# Altium footprint library PowerMonitoring.PcbLib: 27 footprints (part 2 of 2)
Each footprint in its own frame and in the unit in brackets; x right, y up, seen from the top. Pads: shape width x height; smd on the part's side, far side on the other; paste and mask are expansions set on the pad; w line width, h text height; cw(c..) or ccw(c..) is an arc to the next point about the centre after c.
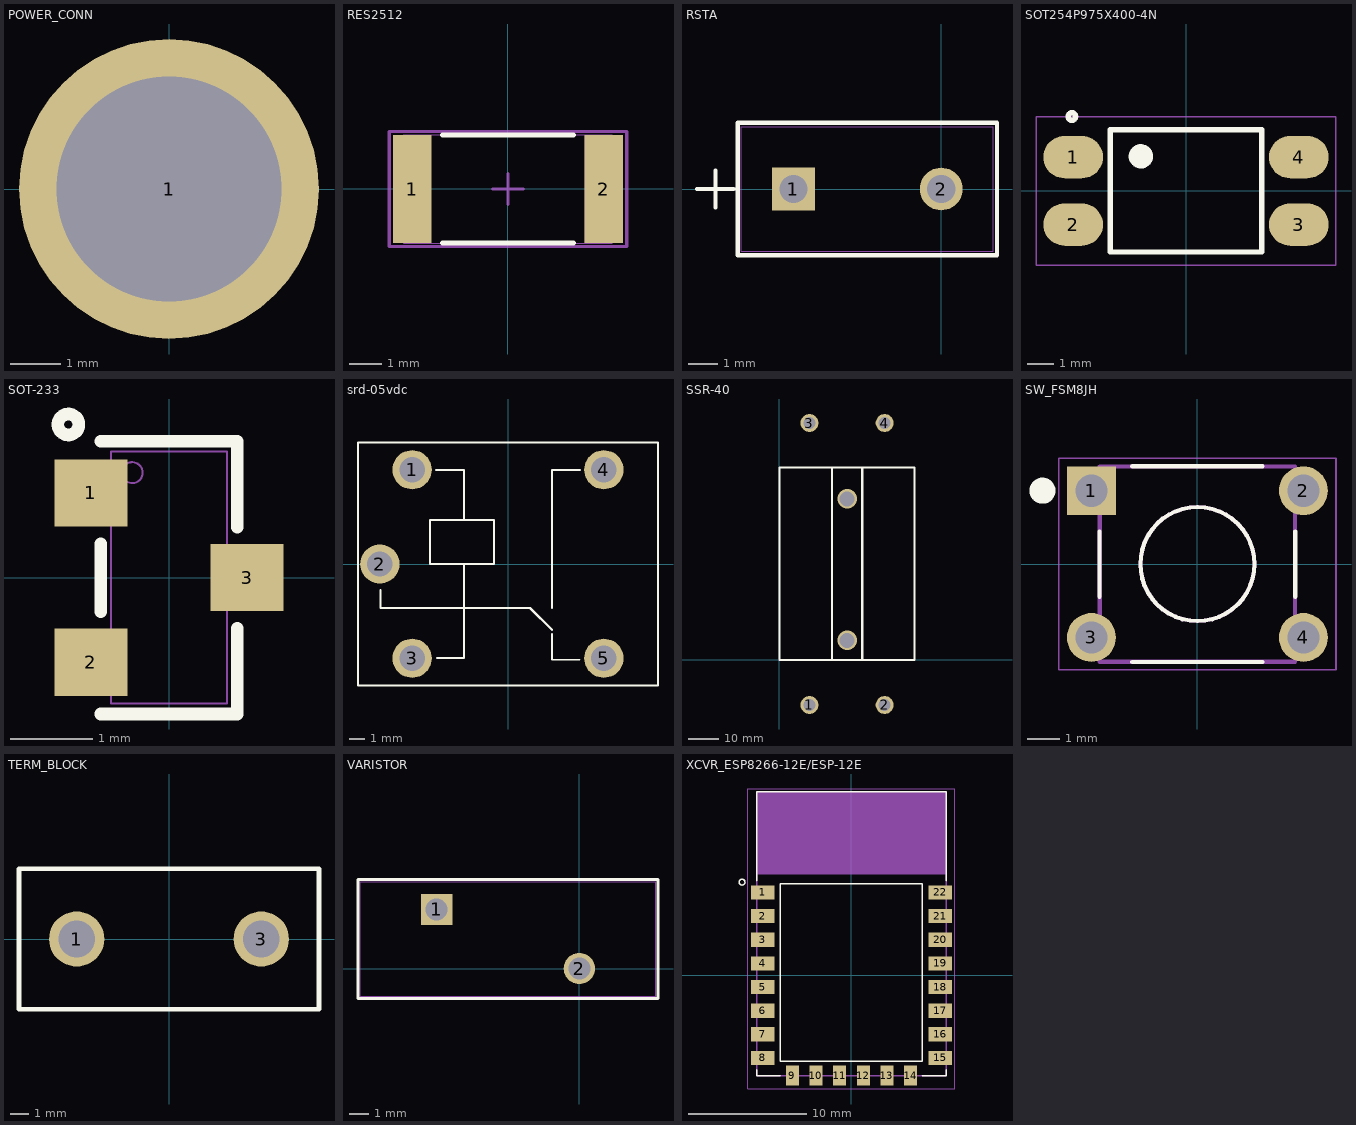
[diagram p1: the footprints below, top view; thin cyan lines are the x and y axes]

## POWER_CONN [mm]
pads (1):
  round 6 hole 4.5: 1(0,0)

## RES2512 [mil]
pads (2):
  rect 47x132 smd: 1(-117,0) 2(117,0)
Top Overlay:
  lines w6: -80,-66 80,-66 ; -80,66 80,66
Mechanical 1:
  lines w0: -94,-66 -94,66 ; -94,-66 -127,-66 -127,66 -94,66 ; -94,-66 94,-66 ; -94,66 94,66 ; 94,-66 94,66 ; 94,-66 127,-66 127,66 94,66
Mechanical 15:
  lines w3.94: -18.7,0 18.7,0 ; 0,-18.7 0,18.7 ; -145,-70 145,-70 145,70 -145,70 -145,-70
3D body "RES2512.stp": height 21.65, standoff 0, extent -124.01,-61.02 124.02,61.03

## RSTA [mil]
pads (2):
  rect 58x58 hole 38 mask-1000: 1(-200,0)
  round 58 hole 38 mask-1000: 2(0,0)
Top Overlay:
  lines w6: -330.5,0 -280.5,0 ; -305.5,-25 -305.5,25 ; -275.5,-89.5 -275.5,89.5 75.5,89.5 75.5,-89.5 -275.5,-89.5
Top Paste:
  region: 0,-29.25 7.57,-28.25 14.63,-25.33 20.68,-20.68 25.33,-14.63 28.25,-7.57 29.25,0 28.25,7.57 25.33,14.63 20.68,20.68 14.63,25.33 7.57,28.25 0,29.25 -7.57,28.25 -14.63,25.33 -20.68,20.68 -25.33,14.63 -28.25,7.57 -29.25,0 -28.25,-7.57 -25.33,-14.63 -20.68,-20.68 -14.63,-25.33 -7.57,-28.25
  region: -229,-29 -171,-29 -171,29 -229,29
Top Solder:
  region: 0,-29.25 7.57,-28.25 14.63,-25.33 20.68,-20.68 25.33,-14.63 28.25,-7.57 29.25,0 28.25,7.57 25.33,14.63 20.68,20.68 14.63,25.33 7.57,28.25 0,29.25 -7.57,28.25 -14.63,25.33 -20.68,20.68 -25.33,14.63 -28.25,7.57 -29.25,0 -28.25,-7.57 -25.33,-14.63 -20.68,-20.68 -14.63,-25.33 -7.57,-28.25
  region: -229,-29 -171,-29 -171,29 -229,29
Bottom Solder:
  region: 0,-29.25 7.57,-28.25 14.63,-25.33 20.68,-20.68 25.33,-14.63 28.25,-7.57 29.25,0 28.25,7.57 25.33,14.63 20.68,20.68 14.63,25.33 7.57,28.25 0,29.25 -7.57,28.25 -14.63,25.33 -20.68,20.68 -25.33,14.63 -28.25,7.57 -29.25,0 -28.25,-7.57 -25.33,-14.63 -20.68,-20.68 -14.63,-25.33 -7.57,-28.25
  region: -229,-29 -171,-29 -171,29 -229,29
Mechanical 1:
  lines w1: -330.5,0 -280.5,0 ; -305.5,-25 -305.5,25 ; -270.5,-84.5 -270.5,84.5 70.5,84.5 70.5,-84.5 -270.5,-84.5
3D body "RSTA.stp": height 319.02, standoff -184.02, extent -270.5,-84.48 70.52,84.5

## SOT254P975X400-4N [mm]
pads (4):
  oval 2.25x1.6 smd: 1(-4.25,1.27) 2(-4.25,-1.27) 3(4.25,-1.27) 4(4.25,1.27)
Top Overlay:
  circle w0.2: c-1.7,1.3 r0.361
  circle w0.2: c-4.3,2.8 r0.141
  region: -2.004,1.6 -1.4,1.6 -1.4,1.002 -2.004,1.002
  lines w0.2: -2.85,-2.3 2.85,-2.3 2.85,2.3 -2.85,2.3 -2.85,-2.3
Mechanical 4:
  lines w0.052: -5.65,-2.8 5.65,-2.8 5.65,2.8 -5.65,2.8 -5.65,-2.8
3D body "PC817.STEP": height 3.83, standoff -0.02, extent -5,-2.29 5,2.29
3D body: height 1.6, standoff 0, extent -0.508,6.096 -0.508,6.096

## SOT-233 [mil] "SOT95P237X112-3N"
pads (3):
  rect 35x32 smd: 1(-37.21,40.35) 2(-37.21,-40.35) 3(37.2,0)
Top Overlay:
  circle w6: c-48,73 r5
  lines w6: -32.56,-65.04 32.56,-65.04 32.56,-24.14 ; -32.56,-16.21 -32.56,16.21 ; -32.56,65.04 32.56,65.04 32.56,24.14
Mechanical 1:
  circle w1: c-17.56,50.04 r5
  lines w1: -49.22,-50.39 -49.22,-30.32 -27.56,-30.32 -27.56,-50.39 -49.22,-50.39 ; -49.22,30.32 -49.22,50.39 -27.56,50.39 -27.56,30.32 -49.22,30.32 ; -27.56,-60.04 -27.56,60.04 27.56,60.04 27.56,-60.04 -27.56,-60.04 ; 27.56,-10.04 27.56,10.04 49.21,10.04 49.21,-10.04 27.56,-10.04
3D body "Package, SOT-23.STEP": height 39.37, standoff 0, extent -51.18,-57.08 51.18,57.09

## srd-05vdc [mm]
pads (5):
  round 2.5 hole 1.6: 1(-6.1,6) 2(-8.162,0) 3(-6.1,-6) 4(6.1,6) 5(6.1,-6)
Top Overlay:
  lines w0.127: -8.128,-1.651 -8.128,-2.794 1.4,-2.8 2.8,-4.2 ; -4.597,5.969 -2.794,5.969 -2.794,2.794 ; -4.521,-5.969 -2.794,-5.969 -2.794,0 ; 2.794,-4.445 2.794,-6.096 4.547,-6.096 ; 2.8,-2.8 2.794,5.969 4.572,5.969 ; -2.794,0 -4.962,0 -4.962,2.8 -0.889,2.8 -0.889,0 -2.794,0 ; -9.55,-7.75 -9.55,7.75 9.55,7.75 9.55,-7.75 -9.55,-7.75
3D body "srd-05vdc.STEP": height 15.4, standoff -4.9, extent -9.523,-7.712 9.577,7.788

## SSR-40 [mm] "SSR-40"
pads (4):
  round 6 hole 4: 1(10,-15) 2(35,-15) 3(10,78.754) 4(35,78.754)
via 22.5,53.5 diameter 6.5 hole 5
via 22.5,6.5 diameter 6.5 hole 5
Top Overlay:
  lines w0.7: 17.5,0 17.5,64.008 ; 27.559,0 27.559,64.008 ; 0,0 44.958,0 44.958,64.008 0,64.008 0,0
3D body "Main Relay Body.STEP": height 22.5, standoff 0, extent 0,0 45,64

## SW_FSM8JH [mm]
pads (4):
  rect 1.498x1.498 hole 0.99: 1(-3.25,2.25)
  round 1.498 hole 0.99: 2(3.25,2.25) 3(-3.25,-2.25) 4(3.25,-2.25)
Top Overlay:
  circle w0.4: c-4.75,2.25 r0.2
  circle w0.127: c0,0 r1.75
  lines w0.127: -3,-1 -3,1 ; -2,-3 2,-3 ; -2,3 2,3 ; 3,-1 3,1
Mechanical 1:
  circle w0.4: c-3.25,2.25 r0.2
  circle w0.127: c0,0 r1.75
  lines w0.127: -2.995,-2.995 2.995,-2.995 2.995,2.995 -2.995,2.995 -2.995,-2.995
Mechanical 4:
  lines w0.05: -4.25,-3.245 -4.25,3.25 4.25,3.25 4.25,-3.245 -4.25,-3.245
3D body "User Library-FSM8JH.step": height 9.5, standoff -3.51, extent -3.898,-2.995 3.9,2.995

## TERM_BLOCK [mm] "BLUE"
pads (2):
  round 3 hole 2: 1(-5,0) 3(5,0)
Top Overlay:
  lines w0.254: -8.128,-3.81 -8.128,3.81 8.128,3.81 8.128,-3.81 -8.128,-3.81
3D body "691102710003.stp": height 9.95, standoff -3.45, extent -8.1,-3.75 8.1,3.75

## VARISTOR [mil] "RES_ERZV14_155X6"
pads (2):
  rect 65x65 hole 45 mask-1000: 1(-295,122)
  round 65 hole 45 mask-1000: 2(0,0)
Top Overlay:
  lines w6: -457.5,-62 162.5,-62 162.5,184 -457.5,184 -457.5,-62
Top Paste:
  region: -327.5,89.5 -262.5,89.5 -262.5,154.5 -327.5,154.5
  region: 0,32.78 -8.48,31.66 -16.39,28.39 -23.18,23.18 -28.39,16.39 -31.66,8.48 -32.78,0 -31.66,-8.48 -28.39,-16.39 -23.18,-23.18 -16.39,-28.39 -8.48,-31.66 0,-32.78 8.48,-31.66 16.39,-28.39 23.18,-23.18 28.39,-16.39 31.66,-8.48 32.78,0 31.66,8.48 28.39,16.39 23.18,23.18 16.39,28.39 8.48,31.66
Top Solder:
  region: -327.5,89.5 -262.5,89.5 -262.5,154.5 -327.5,154.5
  region: 0,32.78 -8.48,31.66 -16.39,28.39 -23.18,23.18 -28.39,16.39 -31.66,8.48 -32.78,0 -31.66,-8.48 -28.39,-16.39 -23.18,-23.18 -16.39,-28.39 -8.48,-31.66 0,-32.78 8.48,-31.66 16.39,-28.39 23.18,-23.18 28.39,-16.39 31.66,-8.48 32.78,0 31.66,8.48 28.39,16.39 23.18,23.18 16.39,28.39 8.48,31.66
Bottom Solder:
  region: -327.5,89.5 -262.5,89.5 -262.5,154.5 -327.5,154.5
  region: 0,32.78 -8.48,31.66 -16.39,28.39 -23.18,23.18 -28.39,16.39 -31.66,8.48 -32.78,0 -31.66,-8.48 -28.39,-16.39 -23.18,-23.18 -16.39,-28.39 -8.48,-31.66 0,-32.78 8.48,-31.66 16.39,-28.39 23.18,-23.18 28.39,-16.39 31.66,-8.48 32.78,0 31.66,8.48 28.39,16.39 23.18,23.18 16.39,28.39 8.48,31.66
Mechanical 1:
  lines w1: -452.5,-57 157.5,-57 157.5,179 -452.5,179 -452.5,-57
3D body "RES_ERZV14_155X6X31.stp": height 727.99, standoff -205, extent -450,-57.99 160,178

## XCVR_ESP8266-12E/ESP-12E [mm]
pads (22):
  rect 2x1.2 smd: 1(-7.5,7) 2(-7.5,5) 3(-7.5,3) 4(-7.5,1) 5(-7.5,-1) 6(-7.5,-3) 7(-7.5,-5) 8(-7.5,-7) 15(7.5,-7) 16(7.5,-5) 17(7.5,-3) 18(7.5,-1) 19(7.5,1) 20(7.5,3) 21(7.5,5) 22(7.5,7)
  rect 1.1x1.7 smd: 9(-5,-8.5) 10(-3,-8.5) 11(-1,-8.5) 12(1,-8.5) 13(3,-8.5) 14(5,-8.5)
Top Overlay:
  circle w0.127: c-9.25,7.875 r0.25
  lines w0.127: -8,-8 -8,-8.5 -6,-8.5 ; -8,8 -8,15.5 8,15.5 8,8 ; 6,-8.5 8,-8.5 8,-8 ; -6,-7.26 -6,7.74 6,7.74 6,-7.26 -6,-7.26
Mechanical 1:
  region: -8.023,15.5 8,15.5 8,8.524 -8.023,8.524
  region: -8.025,15.5 8,15.5 8,8.526 -8.025,8.526
  lines w0.127: -8,-8.5 -8,15.5 8,15.5 8,-8.5 -8,-8.5
Mechanical 4:
  lines w0.05: -8.75,-9.625 -8.75,15.75 8.75,15.75 8.75,-9.625 -8.75,-9.625
3D body "User Library-EPS8266 ESP-12E.step": height 2.65, standoff -0.04, extent -7.949,-8.513 8.061,15.492